# Altium footprint library Mech.PcbLib: 75 footprints (part 5 of 5)
Each footprint in its own frame and in the unit in brackets; x right, y up, seen from the top. Pads: shape width x height; smd on the part's side, far side on the other; paste and mask are expansions set on the pad; w line width, h text height; cw(c..) or ccw(c..) is an arc to the next point about the centre after c.
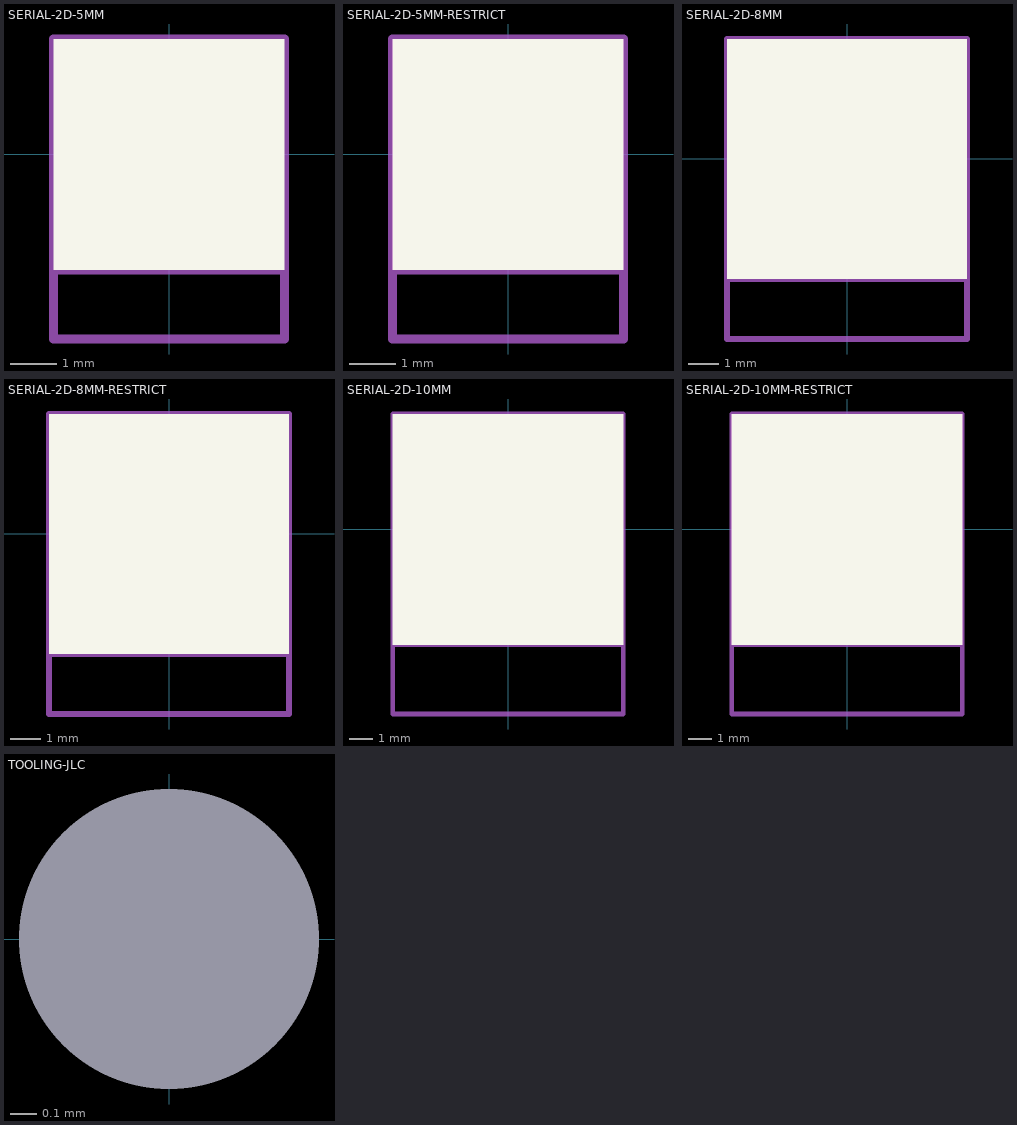
[diagram p4: the footprints below, top view; thin cyan lines are the x and y axes]

## QR-PROJECT-URL-35MM [mm] "QR Code Project URL 35mm"
Top Overlay:
  text ".Project_URL" at -17.5,-17.5 h2

## QR-PROJECT-URL-40MM [mm] "QR Code Project URL 40mm"
Top Overlay:
  text ".Project_URL" at -20,-20 h2

## QR-PROJECT-URL-45MM [mm] "QR Code Project URL 45mm"
Top Overlay:
  text ".Project_URL" at -22.5,-22.5 h2

## QR-PROJECT-URL-50MM [mm] "QR Code Project URL 50mm"
Top Overlay:
  text ".Project_URL" at -25,-25 h2

## SERIAL-2D-5MM [mm] "Placeholder for 2D serial number (Dotmatrix or QR) / Size: 5mm"
Top Overlay:
  rectangle: -2.5,-2.5 2.5,2.5
Top Assembly:
  lines w0.2: -2.5,-2.5 -2.5,-4 2.5,-4 2.5,-2.5 ; -2.5,-2.5 -2.5,2.5 2.5,2.5 2.5,-2.5 ; -2.5,-2.5 2.5,-2.5
  text "000000" at -2.178,-3.724 h1.5

## SERIAL-2D-5MM-RESTRICT [mm] "Placeholder for 2D serial number (Dotmatrix or QR) / Restricts vias, tracks and pads on top layer / Size: 5mm"
Top Layer keep-out:
  rectangle: -2.5,-2.5 2.5,2.5
Top Overlay:
  rectangle: -2.5,-2.5 2.5,2.5
Top Assembly:
  lines w0.2: -2.5,-2.5 -2.5,-4 2.5,-4 2.5,-2.5 ; -2.5,-2.5 -2.5,2.5 2.5,2.5 2.5,-2.5 ; -2.5,-2.5 2.5,-2.5
  text "000000" at -2.178,-3.724 h1.5

## SERIAL-2D-8MM [mm] "Placeholder for 2D serial number (Dotmatrix or QR) / Size: 8mm"
Top Overlay:
  rectangle: -4,-4 4,4
Top Assembly:
  lines w0.2: -4,-4 -4,-6 4,-6 4,-4 ; -4,-4 -4,4 4,4 4,-4 ; -4,-4 4,-4
  text "000000" at -3.63,-5.79 h2.5

## SERIAL-2D-8MM-RESTRICT [mm] "Placeholder for 2D serial number (Dotmatrix or QR) / Restricts vias, tracks and pads on top layer / Size: 8mm"
Top Layer keep-out:
  rectangle: -4,-4 4,4
Top Overlay:
  rectangle: -4,-4 4,4
Top Assembly:
  lines w0.2: -4,-4 -4,-6 4,-6 4,-4 ; -4,-4 -4,4 4,4 4,-4 ; -4,-4 4,-4
  text "000000" at -3.63,-5.79 h2.5

## SERIAL-2D-10MM [mm] "Placeholder for 2D serial number (Dotmatrix or QR) / Size: 10mm"
Top Overlay:
  rectangle: -5,-5 5,5
Top Assembly:
  lines w0.2: -5,-5 5,-5 ; -5,-5 -5,5 5,5 5,-5 ; -5,-5 -5,-8 5,-8 5,-5
  text "000000" at -4.356,-7.449 h3

## SERIAL-2D-10MM-RESTRICT [mm] "Placeholder for 2D serial number (Dotmatrix or QR) / Size: 10mm"
Top Layer keep-out:
  rectangle: -5,-5 5,5
Top Overlay:
  rectangle: -5,-5 5,5
Top Assembly:
  lines w0.2: -5,-5 -5,-8 5,-8 5,-5 ; -5,-5 -5,5 5,5 5,-5 ; -5,-5 5,-5
  text "000000" at -4.356,-7.449 h3

## TOOLING-JLC [mm] "Tooling holes as specified by JLCPCB"
pads (1):
  round 0 hole 1.152 unplated paste-2539.97 mask+0.65: 0(0,0)